# Altium footprint library Reflow3D1411sep.PcbLib: 657 footprints (part 10 of 42)
Each footprint in its own frame and in the unit in brackets; x right, y up, seen from the top. Pads: shape width x height; smd on the part's side, far side on the other; paste and mask are expansions set on the pad; w line width, h text height; cw(c..) or ccw(c..) is an arc to the next point about the centre after c.
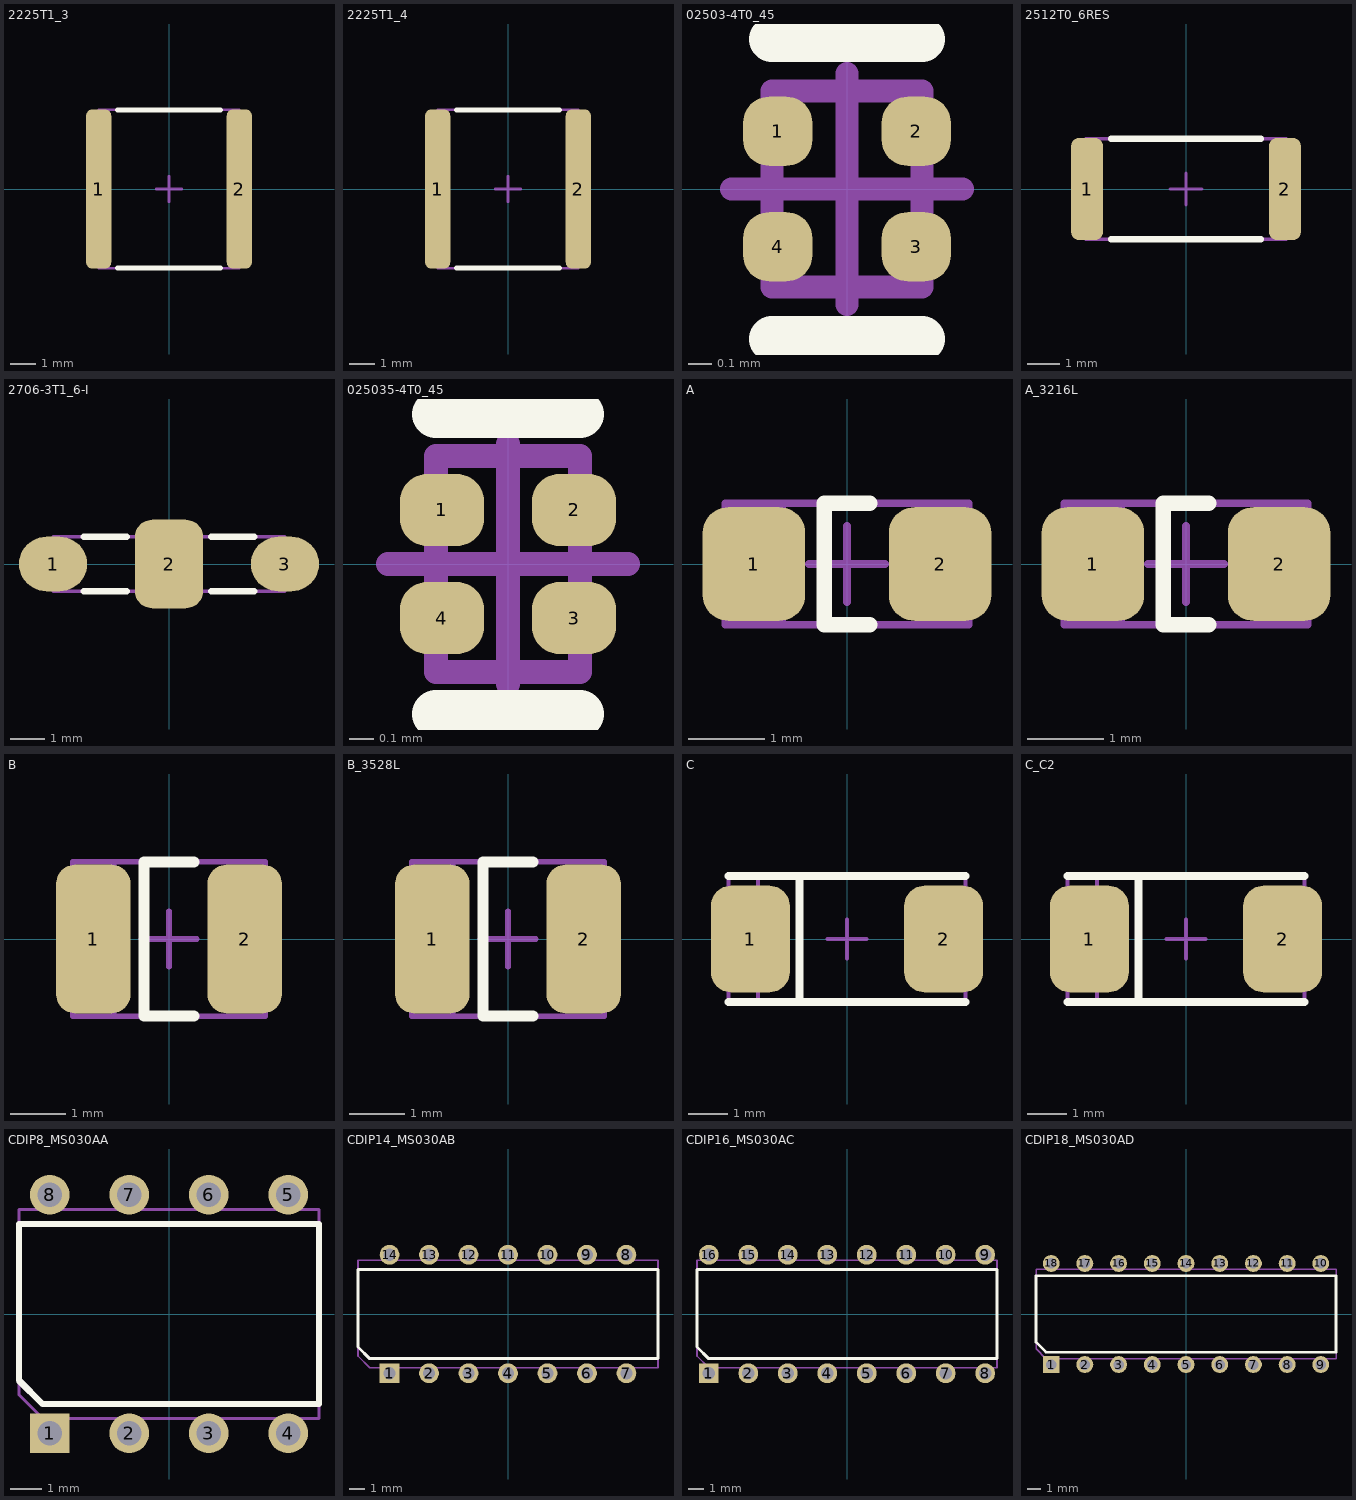
[diagram p9: the footprints below, top view; thin cyan lines are the x and y axes]

## 2225T1_3 [mm] "www.avx.com, smccp.pdf; www.kemet.com, F3102_C0G.pdf"
height 1.3
pads (2):
  rrect50% 1x6.35 smd mask+0.075: 1(-2.8,0) 2(2.8,0)
Top Overlay:
  lines w0.2: -2.05,-3.15 2.05,-3.15 ; -2.05,3.15 2.05,3.15
Mechanical 13:
  lines w0.1: -2.8,-3.15 -2.8,3.15 2.8,3.15 2.8,-3.15 -2.8,-3.15
Mechanical 15:
  lines w0.1: -0.5,0 0.5,0 ; 0,-0.5 0,0.5
3D body: height 1.45, standoff 0, extent -3,-3.35 3,3.35

## 2225T1_4 [mm] "www.avx.com, smccp.pdf; www.kemet.com, F3102_C0G.pdf"
height 1.4
pads (2):
  rrect50% 1x6.35 smd mask+0.075: 1(-2.8,0) 2(2.8,0)
Top Overlay:
  lines w0.2: -2.05,-3.15 2.05,-3.15 ; -2.05,3.15 2.05,3.15
Mechanical 13:
  lines w0.1: -2.8,-3.15 2.8,-3.15 2.8,3.15 -2.8,3.15 -2.8,-3.15
Mechanical 15:
  lines w0.1: -0.5,0 0.5,0 ; 0,-0.5 0,0.5
3D body: height 1.55, standoff 0, extent -3,-3.35 3,3.35

## 02503-4T0_45 [mm] "www.murata.com, c31e.pdf, DLP0NS"
height 0.45
pads (4):
  rrect75% 0.3x0.3 smd mask+0.05: 1(-0.3,0.25) 2(0.3,0.25) 3(0.3,-0.25) 4(-0.3,-0.25)
Top Overlay:
  lines w0.2: -0.325,-0.65 0.325,-0.65 ; -0.325,0.65 0.325,0.65
Mechanical 13:
  lines w0.1: -0.325,-0.425 -0.325,0.425 0.325,0.425 0.325,-0.425 -0.325,-0.425
Mechanical 15:
  lines w0.1: -0.5,0 0.5,0 ; 0,-0.5 0,0.5
3D body: height 0.5, standoff 0, extent -0.35,-0.45 0.35,0.45

## 2512T0_6RES [mm] "www.vishay.com, dcrcwe3.pdf"
height 0.6
pads (2):
  rrect50% 1x3.2 smd mask+0.075: 1(-3.1,0) 2(3.1,0)
Top Overlay:
  lines w0.2: -2.35,-1.575 2.35,-1.575 ; -2.35,1.575 2.35,1.575
Mechanical 13:
  lines w0.1: -3.15,-1.575 -3.15,1.575 3.15,1.575 3.15,-1.575 -3.15,-1.575
Mechanical 15:
  lines w0.1: -0.5,0 0.5,0 ; 0,-0.5 0,0.5
3D body: height 0.7, standoff 0, extent -3.25,-1.65 3.25,1.65

## 2706-3T1_6-I [mm] "www.murata.com, c31e.pdf, NFE61P"
height 1.6
pads (3):
  oval 2x1.6 smd mask+0.075: 1(-3.4,0) 3(3.4,0)
  rrect50% 2x2.6 smd paste-25.4 mask+0.075: 2(0,0)
Top Overlay:
  lines w0.2: -2.5,-0.8 -1.25,-0.8 ; -2.5,0.8 -1.25,0.8 ; 1.25,-0.8 2.5,-0.8 ; 1.25,0.8 2.5,0.8
Top Paste:
  region: 0.75,-1.3 0.75,1.3 -0.75,1.3 -0.75,-1.3
Mechanical 13:
  lines w0.1: -3.4,-0.8 -3.4,0.8 3.4,0.8 3.4,-0.8 -3.4,-0.8
Mechanical 15:
  lines w0.1: -0.5,0 0.5,0 ; 0,-0.5 0,0.5
3D body: height 1.9, standoff 0, extent -3.65,-0.95 3.65,0.95

## 025035-4T0_45 [mm] "www.murata.com, c02e.pdf, GNM0M2"
height 0.45
pads (4):
  rrect75% 0.35x0.3 smd mask+0.05: 1(-0.275,0.225) 2(0.275,0.225) 3(0.275,-0.225) 4(-0.275,-0.225)
Top Overlay:
  lines w0.2: -0.3,-0.625 0.3,-0.625 ; -0.3,0.625 0.3,0.625
Top Solder:
  region: -0.45,-0.175 -0.1,-0.175 -0.1,0.175 -0.45,0.175
  region: 0.1,-0.175 0.45,-0.175 0.45,0.175 0.1,0.175
Mechanical 13:
  lines w0.1: -0.3,-0.45 -0.3,0.45 0.3,0.45 0.3,-0.45 -0.3,-0.45
Mechanical 15:
  lines w0.1: -0.5,0 0.5,0 ; 0,-0.5 0,0.5
3D body: height 0.5, standoff 0, extent -0.325,-0.475 0.325,0.475

## A [mm] "www.nec-tokin.com, capacitors.pdf"
height 1.6
pads (2):
  rrect50% 1.35x1.5 smd mask+0.075: 1(-1.225,0) 2(1.225,0)
Top Overlay:
  lines w0.2: 0.3,-0.8 -0.3,-0.8 -0.3,0.8 0.3,0.8
Mechanical 13:
  lines w0.1: -0.85,-0.8 -0.85,0.8 ; -1.6,-0.8 -1.6,0.8 1.6,0.8 1.6,-0.8 -1.6,-0.8
Mechanical 15:
  lines w0.1: -0.5,0 0.5,0 ; 0,-0.5 0,0.5
3D body: height 1.8, standoff 0, extent -1.7,-0.9 1.7,0.9

## A_3216L [mm] "www.nec-tokin.com, capacitors.pdf"
height 1.1
pads (2):
  rrect50% 1.35x1.5 smd mask+0.075: 1(-1.225,0) 2(1.225,0)
Top Overlay:
  lines w0.2: 0.3,-0.8 -0.3,-0.8 -0.3,0.8 0.3,0.8
Mechanical 13:
  lines w0.1: -0.85,-0.8 -0.85,0.8 ; -1.6,-0.8 -1.6,0.8 1.6,0.8 1.6,-0.8 -1.6,-0.8
Mechanical 15:
  lines w0.1: -0.5,0 0.5,0 ; 0,-0.5 0,0.5
3D body: height 1.2, standoff 0, extent -1.7,-0.9 1.7,0.9

## B [mm] "www.nec-tokin.com, capacitors.pdf"
height 1.9
pads (2):
  rrect50% 1.35x2.7 smd mask+0.075: 1(-1.375,0) 2(1.375,0)
Top Overlay:
  lines w0.2: 0.45,-1.4 -0.45,-1.4 -0.45,1.4 0.45,1.4
Mechanical 13:
  lines w0.1: -1,-1.4 -1,1.4 ; -1.75,-1.4 -1.75,1.4 1.75,1.4 1.75,-1.4 -1.75,-1.4
Mechanical 15:
  lines w0.1: -0.5,0 0.5,0 ; 0,-0.5 0,0.5
3D body: height 2.1, standoff 0, extent -1.85,-1.5 1.85,1.5

## B_3528L [mm] "www.nec-tokin.com, capacitors.pdf"
height 1.1
pads (2):
  rrect50% 1.35x2.7 smd mask+0.075: 1(-1.375,0) 2(1.375,0)
Top Overlay:
  lines w0.2: 0.45,-1.4 -0.45,-1.4 -0.45,1.4 0.45,1.4
Mechanical 13:
  lines w0.1: -1,-1.4 -1,1.4 ; -1.75,-1.4 -1.75,1.4 1.75,1.4 1.75,-1.4 -1.75,-1.4
Mechanical 15:
  lines w0.1: -0.5,0 0.5,0 ; 0,-0.5 0,0.5
3D body: height 1.2, standoff 0, extent -1.85,-1.5 1.85,1.5

## C [mm] "www.nec-tokin.com, capacitors.pdf"
height 2.5
pads (2):
  rrect50% 2x2.7 smd mask+0.075: 1(-2.45,0) 2(2.45,0)
Top Overlay:
  lines w0.2: -3,-1.6 3,-1.6 ; -3,1.6 3,1.6 ; -1.2,-1.6 -1.2,1.6
Mechanical 13:
  lines w0.1: -2.25,-1.6 -2.25,1.6 ; -3,-1.6 -3,1.6 3,1.6 3,-1.6 -3,-1.6
Mechanical 15:
  lines w0.1: -0.5,0 0.5,0 ; 0,-0.5 0,0.5
3D body: height 2.7, standoff 0, extent -3.1,-1.7 3.1,1.7

## C_C2 [mm] "www.nec-tokin.com, capacitors.pdf"
height 1.4
pads (2):
  rrect50% 2x2.7 smd mask+0.075: 1(-2.45,0) 2(2.45,0)
Top Overlay:
  lines w0.2: -3,-1.6 3,-1.6 ; -3,1.6 3,1.6 ; -1.2,-1.6 -1.2,1.6
Mechanical 13:
  lines w0.1: -2.25,-1.6 -2.25,1.6 ; -3,-1.6 -3,1.6 3,1.6 3,-1.6 -3,-1.6
Mechanical 15:
  lines w0.1: -0.5,0 0.5,0 ; 0,-0.5 0,0.5
3D body: height 1.5, standoff 0, extent -3.1,-1.7 3.1,1.7

## CDIP8_MS030AA [mil] "www.ti.com, mcer001a.pdf, JG8.asc"
height 179.92
pads (8):
  rect 50x50 hole 31: 1(-150,-150)
  round 50 hole 31: 2(-50,-150) 3(50,-150) 4(150,-150) 5(150,150) 6(50,150) 7(-50,150) 8(-150,150)
Top Overlay:
  lines w7.87: -188.78,-83.66 -188.78,113.19 188.78,113.19 188.78,-113.19 -159.25,-113.19 -188.78,-83.66
Mechanical 13:
  lines w3.94: -188.78,-101.77 -188.78,131.3 188.78,131.3 188.78,-131.3 -159.25,-131.3 -188.78,-101.77
3D body: height 200, standoff 0, extent -200,-139.96 200,139.96

## CDIP14_MS030AB [mil] "www.ti.com, mcer002d.pdf, J14.asc"
height 177.56
pads (14):
  rect 50x50 hole 31: 1(-300,-150)
  round 50 hole 31: 2(-200,-150) 3(-100,-150) 4(0,-150) 5(100,-150) 6(200,-150) 7(300,-150) 8(300,150) 9(200,150) 10(100,150) 11(0,150) 12(-100,150) 13(-200,150) 14(-300,150)
Top Overlay:
  lines w7.87: -379.92,-83.66 -379.92,113.19 379.92,113.19 379.92,-113.19 -350.39,-113.19 -379.92,-83.66
Mechanical 13:
  lines w3.94: -379.92,-106.69 -379.92,136.22 379.92,136.22 379.92,-136.22 -350.39,-136.22 -379.92,-106.69
3D body: height 200, standoff 0, extent -392.52,-150 392.52,150

## CDIP16_MS030AC [mil] "www.ti.com, mcer002d.pdf, J16.asc"
height 177.56
pads (16):
  rect 50x50 hole 31: 1(-350,-150)
  round 50 hole 31: 2(-250,-150) 3(-150,-150) 4(-50,-150) 5(50,-150) 6(150,-150) 7(250,-150) 8(350,-150) 9(350,150) 10(250,150) 11(150,150) 12(50,150) 13(-50,150) 14(-150,150) 15(-250,150) 16(-350,150)
Top Overlay:
  lines w7.87: -379.92,-83.66 -350.39,-113.19 379.92,-113.19 379.92,113.19 -379.92,113.19 -379.92,-83.66
Mechanical 13:
  lines w3.94: -379.92,-106.69 -350.39,-136.22 379.92,-136.22 379.92,136.22 -379.92,136.22 -379.92,-106.69
3D body: height 200, standoff 0, extent -420.08,-150 420.08,150

## CDIP18_MS030AD [mil] "www.ti.com, mcer002d.pdf, J18.asc"
height 177.56
pads (18):
  rect 50x50 hole 31: 1(-400,-150)
  round 50 hole 31: 2(-300,-150) 3(-200,-150) 4(-100,-150) 5(0,-150) 6(100,-150) 7(200,-150) 8(300,-150) 9(400,-150) 10(400,150) 11(300,150) 12(200,150) 13(100,150) 14(0,150) 15(-100,150) 16(-200,150) 17(-300,150) 18(-400,150)
Top Overlay:
  lines w7.87: -445.08,-83.66 -445.08,113.19 445.08,113.19 445.08,-113.19 -415.55,-113.19 -445.08,-83.66
Mechanical 13:
  lines w3.94: -445.08,-102.95 -445.08,132.48 445.08,132.48 445.08,-132.48 -415.55,-132.48 -445.08,-102.95
3D body: height 200, standoff 0, extent -479.92,-155.12 479.92,155.12